# Altium footprint library SINA.PcbLib: 103 footprints (part 7 of 7)
Each footprint in its own frame and in the unit in brackets; x right, y up, seen from the top. Pads: shape width x height; smd on the part's side, far side on the other; paste and mask are expansions set on the pad; w line width, h text height; cw(c..) or ccw(c..) is an arc to the next point about the centre after c.
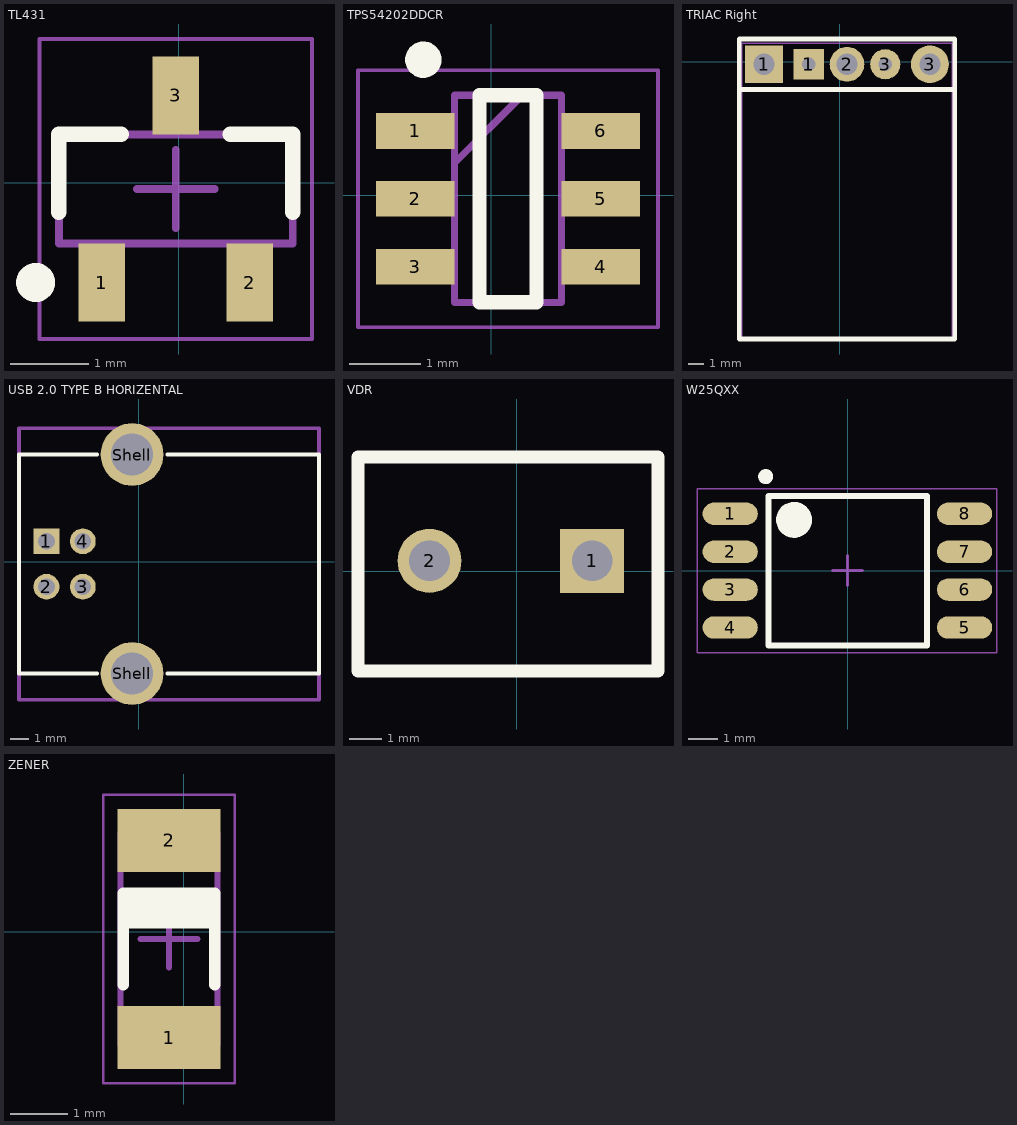
[diagram p6: the footprints below, top view; thin cyan lines are the x and y axes]

## TL431 [mm]
pads (3):
  rect 0.6x1 smd: 1(-0.989,-1.28) 2(0.911,-1.28) 3(-0.039,1.12)
Top Overlay:
  circle w0.25: c-1.839,-1.28 r0.125
  lines w0.2: -1.539,-0.38 -1.539,0.62 -0.739,0.62 ; 0.661,0.62 1.461,0.62 1.461,-0.38
Mechanical 13:
  lines w0.1: -1.539,-0.78 1.461,-0.78 1.461,0.62 -1.539,0.62 -1.539,-0.78
Mechanical 15:
  lines w0.05: -1.789,-2.005 1.711,-2.005 1.711,1.845 -1.789,1.845 -1.789,-2.005
  lines w0.1: -0.539,-0.08 0.461,-0.08 ; -0.039,-0.58 -0.039,0.42
3D body: height 1.1, standoff 0.05, extent -1.539,-0.78 1.461,0.62

## TPS54202DDCR [mm]
pads (6):
  rect 1.1x0.5 smd: 1(-1.065,0.902) 2(-1.065,-0.048) 3(-1.065,-0.998) 4(1.535,-0.998) 5(1.535,-0.048) 6(1.535,0.902)
Top Overlay:
  circle w0.254: c-0.95,1.9 r0.127
  lines w0.2: -0.165,-1.498 -0.165,1.402 0.635,1.402 0.635,-1.498 -0.165,-1.498
Mechanical 13:
  lines w0.1: -0.515,0.452 0.435,1.402 ; -0.515,-1.498 0.985,-1.498 0.985,1.402 -0.515,1.402 -0.515,-1.498
Mechanical 15:
  lines w0.05: -1.865,-1.848 2.335,-1.848 2.335,1.752 -1.865,1.752 -1.865,-1.848
3D body "PRTR5V0U4D.stp": height 1, standoff 0, extent -1.14,-1.498 1.61,1.403

## TRIAC Right [mm]
pads (5):
  rect 2.5x2.5 hole 1.4: 1(-5.025,-0.175)
  rect 2x2 hole 0.9: 1(-2.065,-0.175)
  round 2.3 hole 1.4: 2(0.475,-0.175)
  round 2 hole 0.9: 3(3.015,-0.175)
  round 2.5 hole 1.4: 3(5.975,-0.175)
Top Overlay:
  lines w0.3: 7.625,-18.4 -6.675,-18.4 -6.675,-1.85 ; 7.625,-18.325 7.625,-1.85 ; -6.675,-1.85 7.625,-1.85 ; -6.675,-1.85 -6.675,1.5 7.625,1.5 7.625,-1.85
Mechanical 13:
  lines w0.1: -6.5,-18.4 -6.5,1.225 7.45,1.225 7.45,-18.4 -6.5,-18.4
3D body "User Library-to-220 (3).STEP": height 12.34, standoff -9.48, extent -12.855,-22.773 12.979,5.175

## USB 2.0 TYPE B HORIZENTAL [mm]
pads (6):
  rect 1.42x1.42 hole 0.92: 1(-5.089,1.123)
  round 1.42 hole 0.92: 2(-5.089,-1.377) 3(-3.089,-1.377) 4(-3.089,1.123)
  round 3.45 hole 2.3: Shell(-0.379,-6.147) Shell(-0.379,5.893)
Top Overlay:
  lines w0.2: -2.309,-6.147 -6.599,-6.147 -6.599,5.893 -2.309,5.893 ; 1.551,-6.147 9.901,-6.147 9.901,5.893 1.551,5.893
Mechanical 13:
  lines w0.2: -6.599,-7.597 9.901,-7.597 9.901,7.343 -6.599,7.343 -6.599,-7.597
3D body "61400416121.stp": height 11.1, standoff -3.76, extent -6.599,-7.611 9.901,7.357

## VDR [mm]
pads (2):
  rect 2x2 hole 1.27: 1(2.358,0.331)
  round 2 hole 1.27: 2(-2.722,0.331)
Top Overlay:
  lines w0.406: -4.957,-3.119 -4.957,3.581 4.418,3.581 4.418,-3.119 -4.957,-3.119
Mechanical 13:
  lines w0.1: -4.957,-3.119 -4.957,3.581 4.418,3.581 4.418,-3.119 -4.957,-3.119
3D body "rvar-disk_p5x2-5_d8_th3.stp": height 9.99, standoff -4, extent -4.648,-2.875 4.135,3.337

## W25QXX [mm]
pads (8):
  oval 1.85x0.75 smd: 1(-3.938,1.904) 2(-3.938,0.634) 3(-3.938,-0.636) 4(-3.938,-1.906) 5(3.912,-1.906) 6(3.912,-0.636) 7(3.912,0.634) 8(3.912,1.904)
Top Overlay:
  circle w0.25: c-2.75,3.15 r0.125
  circle w0.6: c-1.8,1.7 r0.3
  lines w0.2: -2.65,-2.501 -2.65,2.499 2.65,2.499 2.65,-2.501 -2.65,-2.501
Mechanical 13:
  circle w0.1: c-1.8,1.7 r0.5
  lines w0.1: -2.65,-2.501 -2.65,2.499 2.7,2.499 2.7,-2.501 -2.65,-2.501
Mechanical 15:
  lines w0.05: -5.05,-2.751 -5.05,2.749 5,2.749 5,-2.751 -5.05,-2.751
  lines w0.1: -0.513,-0.001 0.487,-0.001 ; -0.013,-0.501 -0.013,0.499
3D body "LM358.step": height 1.35, standoff 0, extent -3.263,-2.501 3.237,2.499

## ZENER [mm]
pads (2):
  rect 1.8x1.1 smd: 1(-0.254,-1.852) 2(-0.254,1.598)
Top Overlay:
  region: 0.616,0.053 0.616,0.603 -0.984,0.603 -0.984,0.053
  lines w0.2: -1.054,-0.927 -1.054,0.673 0.546,0.673 0.546,-0.927
Mechanical 13:
  lines w0.1: -1.104,-1.982 0.596,-1.982 0.596,1.728 -1.104,1.728 -1.104,-1.982
Mechanical 15:
  lines w0.05: -1.404,-2.652 0.896,-2.652 0.896,2.398 -1.404,2.398 -1.404,-2.652
  lines w0.1: -0.754,-0.127 0.246,-0.127 ; -0.254,-0.627 -0.254,0.373
3D body: height 1.69, standoff 0, extent -1.101,-1.982 0.596,-1.612
3D body: height 1.68, standoff 0.04, extent -1.072,-1.012 0.567,-0.412
3D body: height 1.68, standoff 0.04, extent -1.071,-1.612 0.566,1.358
3D body: height 1.69, standoff 0, extent -1.101,1.358 0.596,1.728